# Altium footprint library ZJUDancer_Circuit_V3.6.3.PcbLib: 35 footprints (part 3 of 3)
Each footprint in its own frame and in the unit in brackets; x right, y up, seen from the top. Pads: shape width x height; smd on the part's side, far side on the other; paste and mask are expansions set on the pad; w line width, h text height; cw(c..) or ccw(c..) is an arc to the next point about the centre after c.
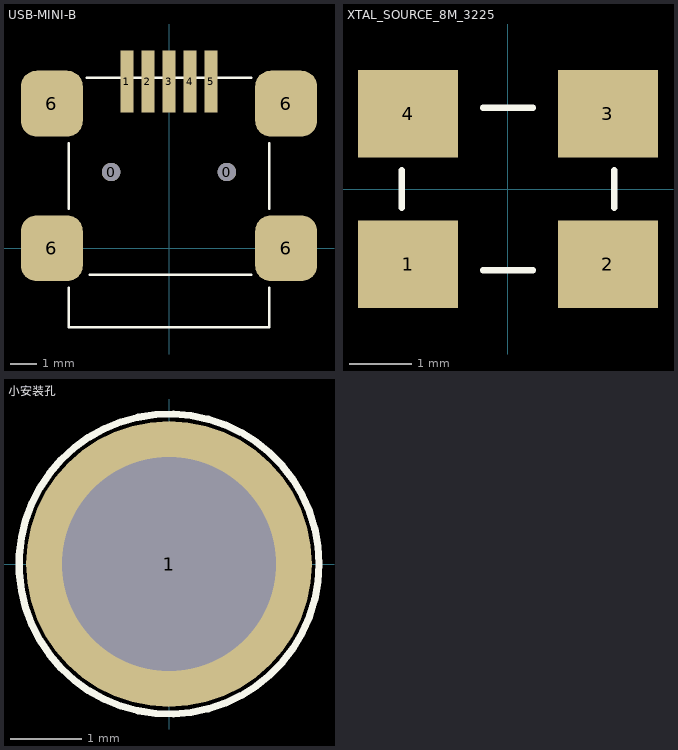
[diagram p2: the footprints below, top view; thin cyan lines are the x and y axes]

## USB-MINI-B [mm]
pads (11):
  round 0.7 hole 0.7: 0(-2.2,2.9) 0(2.2,2.9)
  rect 0.5x2.35 smd: 1(-1.6,6.335) 2(-0.8,6.335) 3(0,6.335) 4(0.8,6.335) 5(1.6,6.335)
  rrect50% 2.35x2.5 smd: 6(-4.45,0) 6(-4.45,5.5) 6(4.45,0) 6(4.45,5.5)
Top Overlay:
  lines w0.1: -3.81,-1.5 -3.81,-3 3.81,-3 3.81,-1.5 ; -3.81,1.5 -3.81,4 ; -3.125,6.477 3.125,6.477 ; -3,-1 3.125,-1 ; 3.81,1.5 3.81,4
3D body: height 3.97, standoff 0.02, extent -5.358,-3.258 5.342,7.142

## XTAL_SOURCE_8M_3225 [mm]
pads (4):
  rect 1.6x1.4 smd: 1(-1.6,-1.2) 2(1.6,-1.2) 3(1.6,1.2) 4(-1.6,1.2)
Top Overlay:
  lines w0.1: -1.7,-0.3 -1.7,0.3 ; -0.4,-1.3 0.4,-1.3 ; -0.4,1.3 0.4,1.3 ; 1.7,-0.3 1.7,0.3
3D body: height 0.98, standoff 0.02, extent -1.6,-1.25 1.6,1.25

## 小安装孔 [mm]
pads (1):
  round 4 hole 3: 1(0,0)
Top Overlay:
  circle w0.1: c0,0 r2.1